# Altium footprint library Mine.PcbLib: 306 footprints (part 17 of 20)
Each footprint in its own frame and in the unit in brackets; x right, y up, seen from the top. Pads: shape width x height; smd on the part's side, far side on the other; paste and mask are expansions set on the pad; w line width, h text height; cw(c..) or ccw(c..) is an arc to the next point about the centre after c.
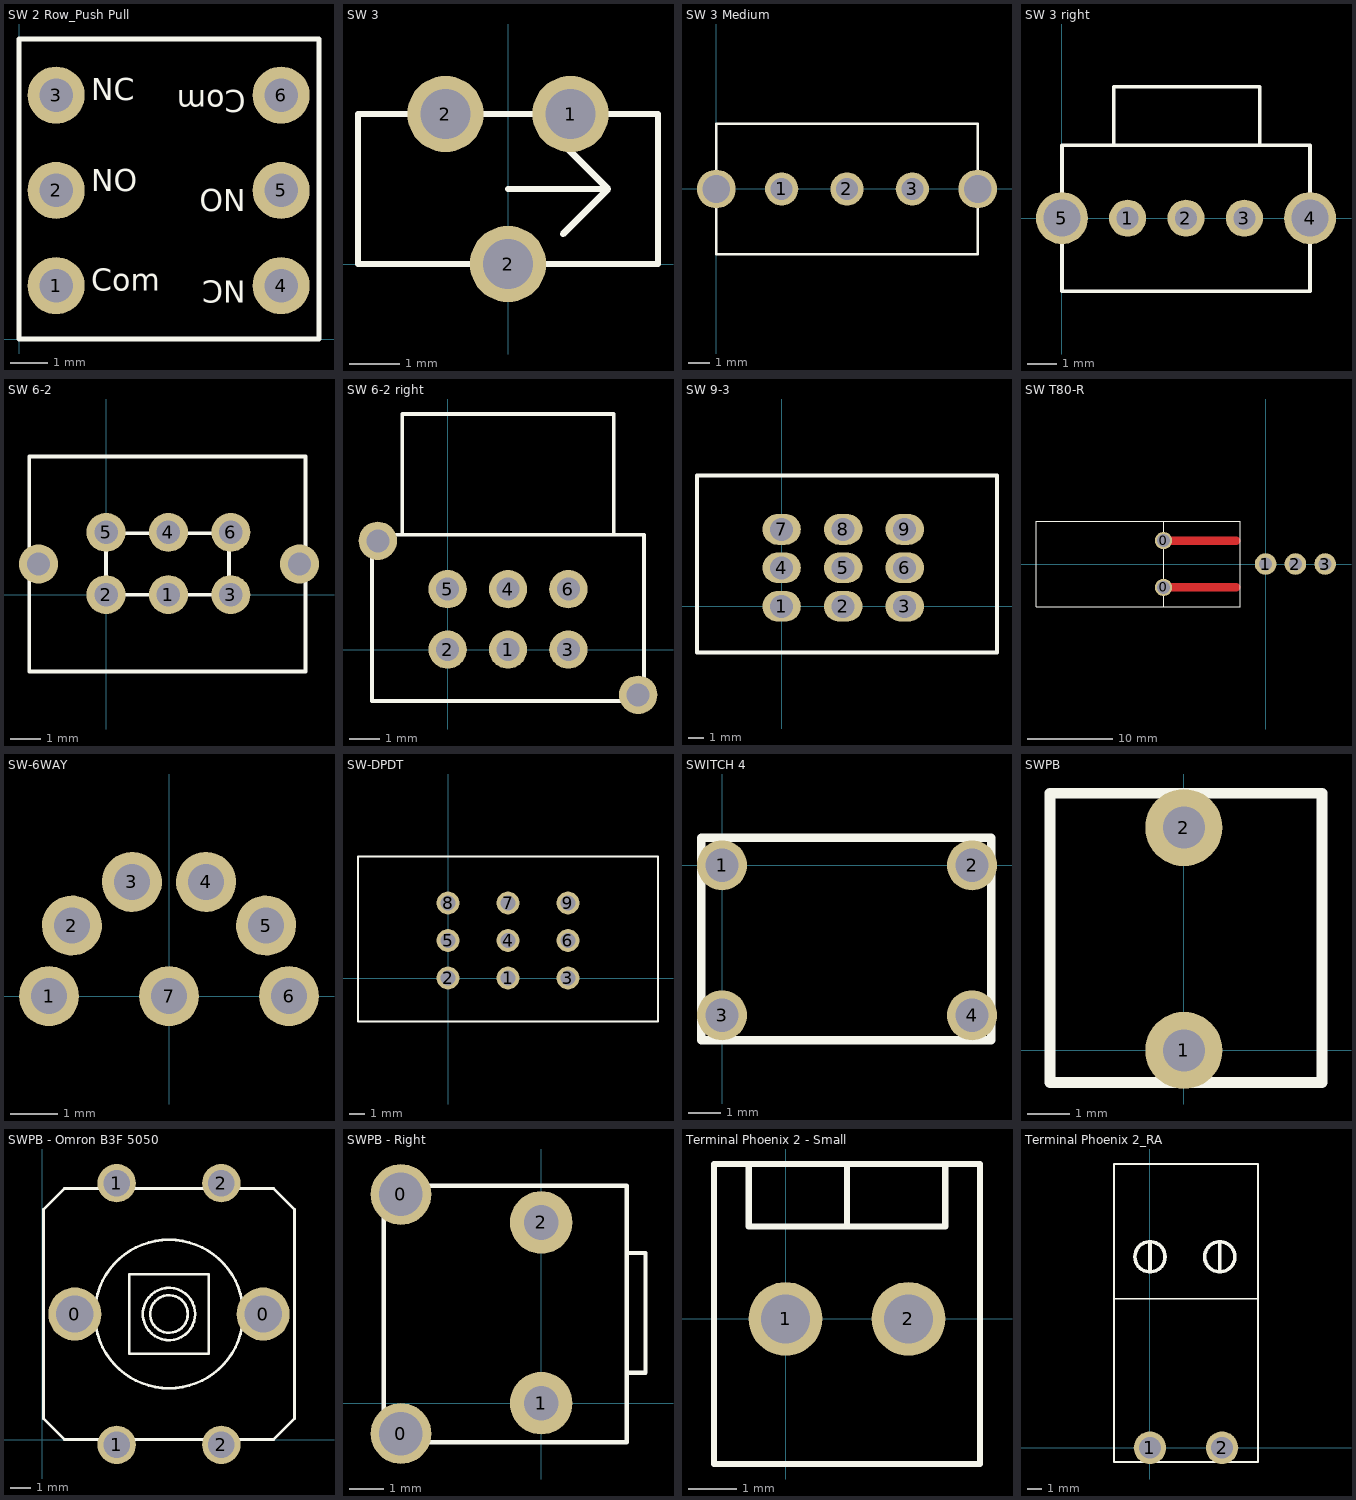
[diagram p16: the footprints below, top view; thin cyan lines are the x and y axes]

## SW 2 Row_Push Pull [mil]
height 314.96
pads (6):
  round 60 hole 35: 1(39,56) 2(39,156) 3(39,256) 4(275.22,56) 5(275.22,156) 6(275.22,256)
Top Overlay:
  lines w5: 0,0 0,314.96 314.96,314.96 314.96,0 0,0
  text "Com" at 238.22,269 h39.37
  text "NO" at 238.22,165 h39.37
  text "NC" at 238.22,69 h39.37
  text "NC" at 76,243 h39.37
  text "NO" at 76,147 h39.37
  text "Com" at 76,43 h39.37

## SW 3 [mm]
pads (3):
  round 1.524 hole 1: 1(1.25,3) 2(-1.25,3) 2(0,0)
Top Overlay:
  lines w0.127: 0,1.5 2,1.5 ; 1.1,0.6 2,1.5 ; 1.1,2.4 2,1.5 ; -3,0 -3,3 3,3 3,0 -3,0

## SW 3 Medium [mil]
height 236.22
pads (5):
  round 60 hole 40: 1(118.11,0) 2(236.22,0) 3(354.33,0)
  round 70 hole 50: ""(0,0) ""(472.44,0)
Top Overlay:
  lines w5: 0,-118.11 472.44,-118.11 472.44,118.11 0,118.11 0,-118.11

## SW 3 right [mil]
height 196.85
pads (5):
  round 50 hole 30: 1(88.58,0) 2(167.32,0) 3(246.06,0)
  round 70 hole 50: 4(334.65,0) 5(0,0)
Top Overlay:
  lines w5: 70,98.43 70,177.17 266.85,177.17 266.85,98.43 ; 0,-98.43 334.65,-98.43 334.65,98.43 0,98.43 0,-98.43

## SW 6-2 [mil]
height 196.85
pads (8):
  round 50 hole 30: 1(80,0) 2(0,0) 3(160,0) 4(80,80) 5(0,80) 6(160,80) ""(-86.61,39.37) ""(248.03,39.37)
Top Overlay:
  lines w5: -98.43,-98.43 -98.43,177.17 255.91,177.17 255.91,-98.43 -98.43,-98.43 ; 0,0 157.48,0 157.48,78.74 0,78.74 0,0

## SW 6-2 right [mm]
height 5
pads (8):
  round 1.27 hole 0.762: 1(2,0) 2(0,0) 3(4,0) 4(2,2) 5(0,2) 6(4,2) ""(-2.31,3.6) ""(6.309,-1.5)
Top Overlay:
  lines w0.127: -1.5,3.8 -1.5,7.8 5.5,7.8 5.5,3.8 ; -2.5,-1.7 -2.5,3.8 6.5,3.8 6.5,-1.7 -2.5,-1.7

## SW 9-3 [mil]
pads (9):
  oval 100x80 hole 60: 1(0,0) 2(160,0) 3(320,0) 4(0,100) 5(160,100) 6(320,100) 7(0,200) 8(160,200) 9(320,200)
Top Overlay:
  lines w10: 555,-120 -220,-120 -220,340 560,340 560,-120

## SW T80-R [mil] "SaleCom"
height 590.55
pads (5):
  round 80 hole 60: 0(-472.44,-108.27) 0(-472.44,108.27)
  round 100 hole 60: 1(0,0) 2(137.8,0) 3(275.59,0)
Top Layer:
  lines w39.37: -472.44,-108.27 -135,-108.27 ; -472.44,108.27 -135,108.27
Top Overlay:
  lines w5: -472.44,-196.85 -472.44,196.85 ; -1062.99,-196.85 -1062.99,196.85 -118.11,196.85 -118.11,-196.85 -1062.99,-196.85

## SW-6WAY [mil]
pads (7):
  round 50 hole 30: 1(-100,0) 2(-80.9,58.78) 3(-30.9,95.11) 4(30.9,95.11) 5(80.9,58.78) 6(100,0) 7(0,0)

## SW-DPDT [mil]
height 354.33
pads (9):
  round 60 hole 40: 1(157.48,0) 2(0,0) 3(314.96,0) 4(157.48,98.43) 5(0,98.43) 6(314.96,98.43) 7(157.48,196.85) 8(0,196.85) 9(314.96,196.85)
Top Overlay:
  lines w5: -236.22,-114.17 -236.22,318.9 551.18,318.9 551.18,-114.17 -236.22,-114.17

## SWITCH 4 [mil]
pads (4):
  round 60 hole 40: 1(0,0) 2(300,0) 3(0,-180) 4(300,-180)
Top Overlay:
  lines w10: -25,-210 323,-210 323,33 -25,33 -25,-210

## SWPB [mil]
pads (2):
  round 72 hole 39: 1(0,0) 2(0,208)
Top Overlay:
  lines w10: -125,-30 129,-30 129,240 -125,240 -125,-30

## SWPB - Omron B3F 5050 [mil]
pads (6):
  round 100 hole 70: 0(61.37,236.22) 0(415.7,236.22)
  round 72 hole 50: 1(140.11,-9.84) 1(140.11,482.6) 2(336.96,-9.84) 2(336.96,482.6)
Top Overlay:
  circle w5: c238.53,236.38 r49.21
  circle w5: c238.53,236.38 r35.43
  circle w5: c238.53,236.38 r139.76
  lines w5: 2.31,39.53 2.31,433.23 41.69,472.6 435.39,472.6 474.76,433.23 474.76,39.53 435.39,0.16 41.69,0.16 2.32,39.53 ; 163.73,161.57 313.34,161.57 313.34,311.18 163.73,311.18 163.73,161.57

## SWPB - Right [mil]
height 295.28
pads (4):
  round 70 hole 50: 0(-161.42,-35) 0(-161.42,240.28)
  round 72 hole 40: 1(0,0) 2(0,208)
Top Overlay:
  lines w5: 98.43,35 120,35 120,172.8 100.93,172.8 ; -181.1,-45 98.43,-45 98.43,250.28 -181.1,250.28 -181.1,-45

## Terminal Phoenix 2 - Small [mil] "KF12B"
height 354.33
pads (2):
  round 60 hole 40: 1(0,0) 2(100,0)
Top Overlay:
  lines w5: -30,125.98 -30,75 130,75 130,125.98 ; 50,75 50,125.98 ; -58.27,-118.11 158.27,-118.11 158.27,125.98 -58.27,125.98 -58.27,-118.11

## Terminal Phoenix 2_RA [mil] "2EDGK-5.08"
height 590.55
pads (2):
  round 90 hole 60: 1(0,0) 2(200,0)
Top Overlay:
  circle w10: c193.7,529.92 r41.85
  circle w10: c0,529.92 r41.85
  lines w5: -98.43,413.39 300,413.39 ; -100,-39.37 -100,787.4 300,787.4 300,-39.37 -100,-39.37
  lines w10: 0,490.55 0,569.29 ; 193.7,490.55 193.7,569.29